# Altium footprint library IC.PcbLib: 162 footprints (part 9 of 11)
Each footprint in its own frame and in the unit in brackets; x right, y up, seen from the top. Pads: shape width x height; smd on the part's side, far side on the other; paste and mask are expansions set on the pad; w line width, h text height; cw(c..) or ccw(c..) is an arc to the next point about the centre after c.
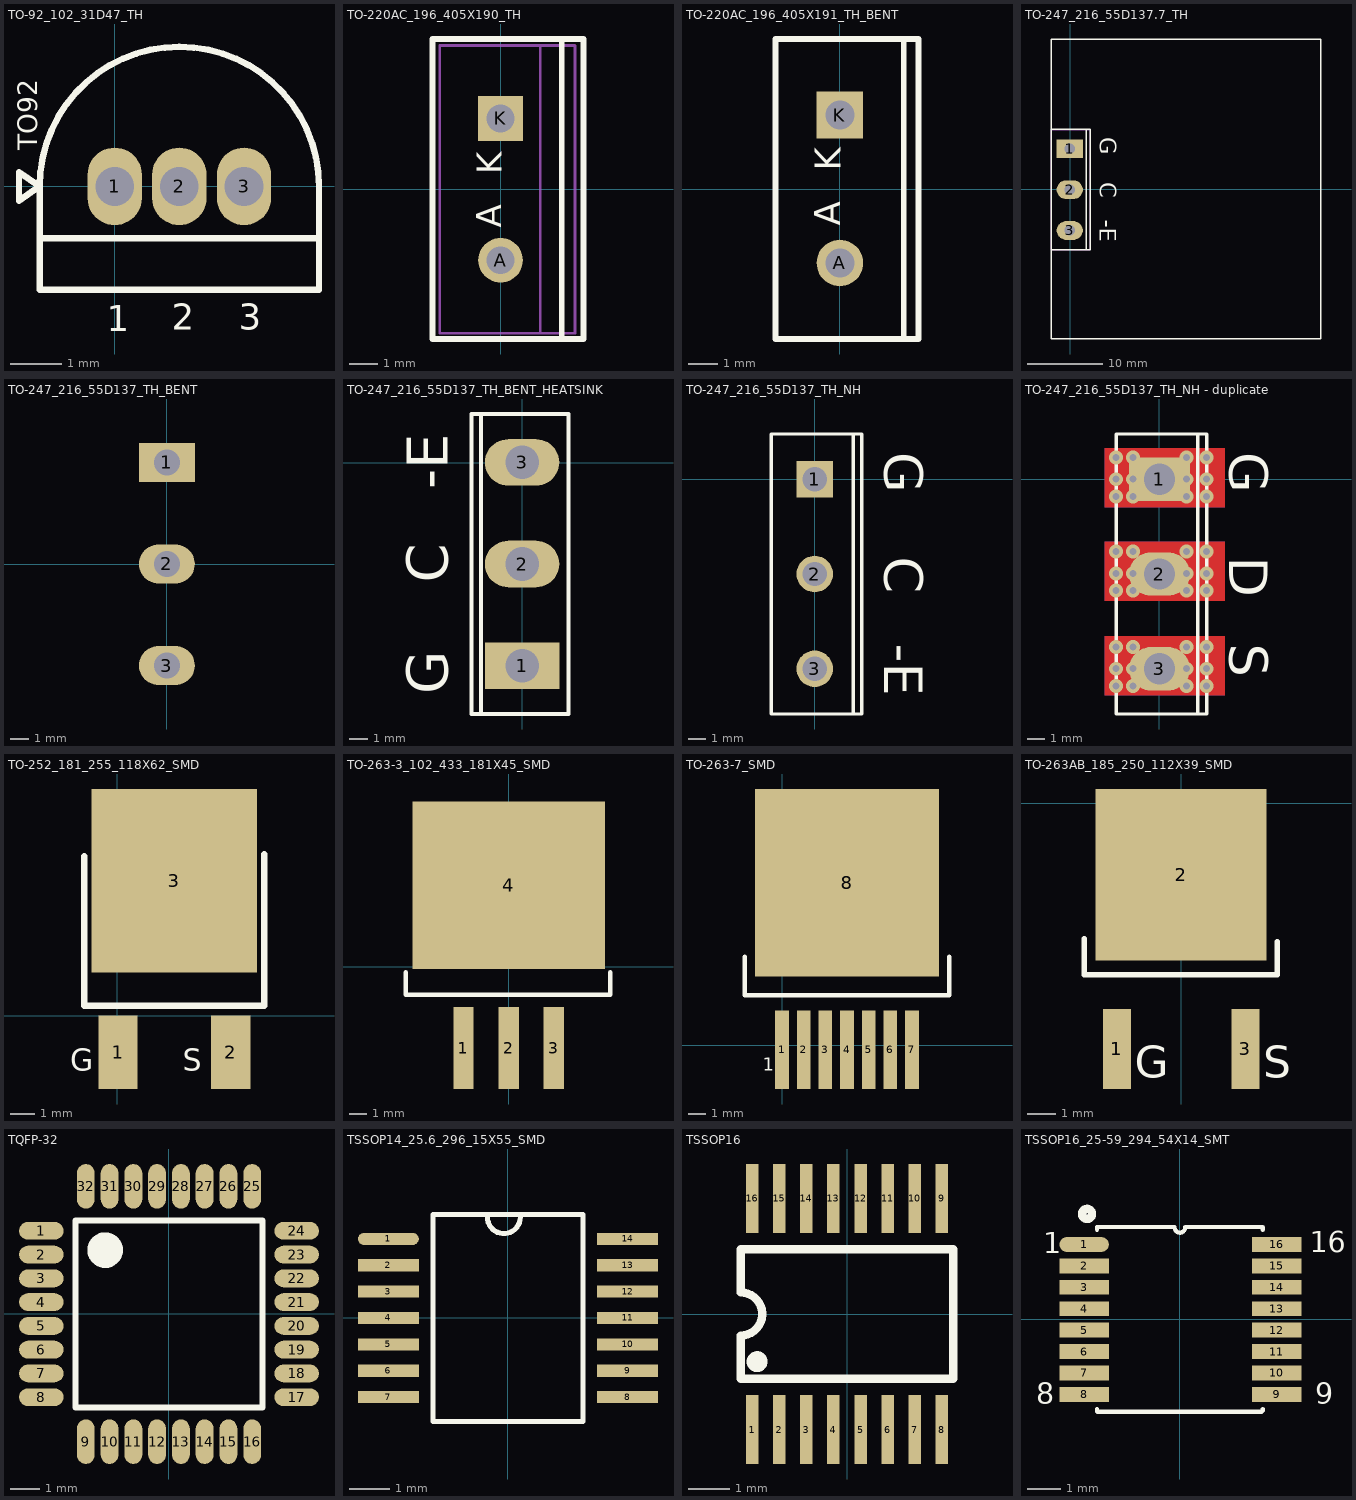
[diagram p8: the footprints below, top view; thin cyan lines are the x and y axes]

## TO-92_102_31D47_TH [mil] "CASE: TH"
height 342.52
pads (3):
  oval 42x60 hole 30 mask+3: 1(0,0) 2(50,0) 3(100,0)
Top Overlay:
  lines w5: -58,-40 158,-40 ; -58,0 cw(c50,0) 158,0 158,-80 -58,-80 -58,0 ; -58,0 -74,-11 -74,11 -58,0
  text "1" at -6,-112 h20
  text "2" at 44,-111 h20
  text "3" at 96,-111 h20
  text "TO92" at -60,28 h15
3D body "TO-92-2.STEP": height 418.5, standoff -140.55, extent -44.37,-63.73 144.39,93.75

## TO-220AC_196_405X190_TH [mm] "FM, 2-Leads, Body 10.3x4.85mm, Pitch 5.08mm"
height 19.05
pads (2):
  round 1.6 hole 1: A(0,-2.54)
  rect 1.6x1.6 hole 1: K(0,2.54)
Top Overlay:
  lines w0.2: 2.184,-5.258 2.195,5.334 ; -2.438,-5.359 2.972,-5.359 2.972,5.385 -2.438,5.385 -2.438,-5.359
  text "A" at 0.33,-1.372 h1.52
  text "K" at 0.356,0.533 h1.52
Mechanical 8:
  lines w0.1: 1.42,-5.15 1.42,5.15 ; -2.18,-5.15 2.67,-5.15 2.67,5.15 -2.18,5.15 -2.18,-5.15
3D body: height 14.33, standoff 12.8, extent 1.42,-4.975 2.67,4.975
3D body: height 19.05, standoff 18.18, extent 1.42,-4.975 2.67,4.975
3D body: height 14.37, standoff 14.33, extent 1.42,-4.975 2.67,-0.376
3D body: height 18.18, standoff 18.14, extent 1.42,-4.975 2.67,-0.376
3D body: height 14.48, standoff 14.36, extent 1.42,-4.975 2.67,-0.737
3D body: height 18.14, standoff 18.03, extent 1.42,-4.975 2.67,-0.737
3D body: height 2.79, standoff 0, extent -0.25,1.875 0.25,3.205
3D body: height 14.37, standoff 14.33, extent 1.42,0.376 2.67,4.975
3D body: height 18.18, standoff 18.14, extent 1.42,0.376 2.67,4.975
3D body: height 14.48, standoff 14.36, extent 1.42,0.737 2.67,4.975
3D body: height 18.14, standoff 18.03, extent 1.42,0.737 2.67,4.975
3D body: height 14.65, standoff 14.47, extent 1.42,1.069 2.67,4.975
3D body: height 18.03, standoff 17.85, extent 1.42,1.069 2.67,4.975
3D body: height 14.89, standoff 14.65, extent 1.42,1.361 2.67,4.975
3D body: height 17.86, standoff 17.61, extent 1.42,1.361 2.67,4.975
3D body: height 15.19, standoff 14.89, extent 1.42,1.601 2.67,4.975
3D body: height 17.62, standoff 17.32, extent 1.42,1.601 2.67,4.975
3D body: height 15.52, standoff 15.18, extent 1.42,1.778 2.67,4.975
3D body: height 17.32, standoff 16.99, extent 1.42,1.778 2.67,4.975
3D body: height 15.88, standoff 15.51, extent 1.42,1.888 2.67,4.975
3D body: height 16.99, standoff 16.63, extent 1.42,1.888 2.67,4.975
3D body: height 16.25, standoff 15.87, extent 1.42,1.925 2.67,4.975
3D body: height 16.63, standoff 16.25, extent 1.42,1.925 2.67,4.975
3D body: height 2.79, standoff 0, extent -0.25,-3.205 0.25,-1.875
3D body: height 14.65, standoff 14.47, extent 1.42,-4.975 2.67,-1.069
3D body: height 18.03, standoff 17.85, extent 1.42,-4.975 2.67,-1.069
3D body: height 14.89, standoff 14.65, extent 1.42,-4.975 2.67,-1.361
3D body: height 17.86, standoff 17.61, extent 1.42,-4.975 2.67,-1.361
3D body: height 15.19, standoff 14.89, extent 1.42,-4.975 2.67,-1.601
3D body: height 17.62, standoff 17.32, extent 1.42,-4.975 2.67,-1.601
3D body: height 15.52, standoff 15.18, extent 1.42,-4.975 2.67,-1.778
3D body: height 17.32, standoff 16.99, extent 1.42,-4.975 2.67,-1.778
3D body: height 15.88, standoff 15.51, extent 1.42,-4.975 2.67,-1.888
3D body: height 16.99, standoff 16.63, extent 1.42,-4.975 2.67,-1.888
3D body: height 16.25, standoff 15.87, extent 1.42,-4.975 2.67,-1.925
3D body: height 16.63, standoff 16.25, extent 1.42,-4.975 2.67,-1.925
3D body: height 0, standoff -1.6, extent -0.25,2.155 0.25,2.925
3D body: height 0, standoff -1.6, extent -0.25,-2.925 0.25,-2.155
3D body: height 12.8, standoff 2.79, extent -2.18,-5.15 2.67,5.15

## TO-220AC_196_405X191_TH_BENT [mm]
pads (2):
  round 1.6 hole 1: A(0,-2.54)
  rect 1.6x1.6 hole 1: K(0,2.54)
Top Overlay:
  lines w0.2: 2.195,-5.15 2.195,5.15 ; -2.205,-5.15 2.695,-5.15 2.695,5.15 -2.205,5.15 -2.205,-5.15
  text "K" at 0.33,0.635 h1.52
  text "A" at 0.305,-1.27 h1.52
3D body "User Library-TO220 L.step": height 7.2, standoff -0.3, extent -0.052,-4.9 19.652,5.1

## TO-247_216_55D137.7_TH [mm]
pads (3):
  rect 3.5x2.5 hole 1.4: 1(-0.076,5.425)
  oval 3.5x2.5 hole 1.4: 2(-0.076,-0.025) 3(-0.076,-5.475)
Top Overlay:
  lines w0.178: 2.134,-8.075 2.134,8.025 ; 33.426,20.091 -2.566,20.091 -2.566,8.025 ; 33.452,20.091 33.452,-19.964 -2.565,-19.964 -2.565,-8.076 -2.566,-8.075 ; -2.566,-8.075 -2.566,8.025 ; -2.566,-8.075 2.634,-8.075 2.634,8.025 -2.566,8.025
  text "G" at 3.924,6.975 h2.2
  text "C" at 3.924,0.975 h2.2
  text "-E" at 3.924,-4.025 h2.2
Mechanical 13:
  lines w0.1: 2.634,-8.05 2.634,8 ; 2.634,-8.05 -2.566,-8.05 -2.566,8 2.634,8 ; 2.634,-8.05 2.634,8
3D body "tony_assembly_14_asm.stp": height 52, standoff -2.2, extent -2.591,-19.949 33.57,20.051

## TO-247_216_55D137_TH_BENT [mm] "IGBT"
height 12
pads (3):
  rect 3x2.1 hole 1.4: 1(0,5.45)
  oval 3x2.1 hole 1.4: 2(0,0) 3(0,-5.45)
Bottom Overlay:
  lines w0.2: 2.21,-8.05 2.21,8.05 ; -2.49,-8.05 -2.49,8.05 2.71,8.05 2.71,-8.05 -2.49,-8.05
  text "E" at -5.5,-8 h2.2
  text "G" at -5.5,5 h2.2
  text "C" at -5.5,-0.5 h2.2
3D body "IGBT.STEP": height -5, standoff -9.9, extent 3.9,-7.75 23.9,7.75

## TO-247_216_55D137_TH_BENT_HEATSINK [mm] "CASE: TO-247"
height 30
pads (3):
  rect 4x2.5 hole 1.8: 1(0,-10.871)
  oval 4x2.5 hole 1.8: 2(0,-5.421) 3(0,0.029)
Top Overlay:
  lines w0.2: -2.21,-13.471 -2.21,2.629 ; -2.71,-13.471 -2.71,2.629 2.49,2.629 2.49,-13.471 -2.71,-13.471
  text "G" at -4,-12.421 h2.2
  text "C" at -4,-6.421 h2.2
  text "-E" at -4,-1.421 h2.2
3D body "IGBT and Heatsink.STEP": height 18.01, standoff -3.99, extent -7.173,-25.461 32.827,14.539

## TO-247_216_55D137_TH_NH [mm]
pads (3):
  rect 2.1x2.1 hole 1.4: 1(0,0)
  round 2.1 hole 1.4: 2(0,-5.45) 3(0,-10.9)
Top Overlay:
  lines w0.2: 2.21,-13.5 2.21,2.6 ; -2.49,-13.5 -2.49,2.6 2.71,2.6 2.71,-13.5 -2.49,-13.5
  text "G" at 4,1.55 h2.2
  text "C" at 4,-4.45 h2.2
  text "-E" at 4,-9.45 h2.2
3D body: height 25.57, standoff 4.17, extent -2.49,-13.475 2.71,2.575

## TO-247_216_55D137_TH_NH - duplicate [mm] "Power Mosfet"
height 24.78
pads (3):
  rect 3.5x2.5 hole 1.8: 1(0,0)
  oval 3.5x2.5 hole 1.8: 2(0,-5.45) 3(0,-10.9)
via -2.489,1.245 diameter 0.8 hole 0.4
via -2.49,-0.991 diameter 0.8 hole 0.4
via -2.489,0 diameter 0.8 hole 0.4
via -1.524,1.245 diameter 0.8 hole 0.4
via -1.524,-0.991 diameter 0.8 hole 0.4
via -1.524,-0.991 diameter 0.8 hole 0.4
via -1.524,0 diameter 0.8 hole 0.4
via 1.549,-0.991 diameter 0.8 hole 0.4
via 1.549,0 diameter 0.8 hole 0.4
via 1.549,1.245 diameter 0.8 hole 0.4
via 2.71,1.245 diameter 0.8 hole 0.4
via 2.71,0 diameter 0.8 hole 0.4
via 2.71,-0.991 diameter 0.8 hole 0.4
via 2.711,-6.401 diameter 0.8 hole 0.4
via 2.711,-5.41 diameter 0.8 hole 0.4
via 2.711,-4.166 diameter 0.8 hole 0.4
via 1.55,-4.166 diameter 0.8 hole 0.4
via 1.55,-5.41 diameter 0.8 hole 0.4
via 1.55,-6.401 diameter 0.8 hole 0.4
via -1.523,-5.41 diameter 0.8 hole 0.4
via -1.523,-6.401 diameter 0.8 hole 0.4
via -1.523,-4.166 diameter 0.8 hole 0.4
via -2.488,-5.41 diameter 0.8 hole 0.4
via -2.489,-6.401 diameter 0.8 hole 0.4
via -2.488,-4.166 diameter 0.8 hole 0.4
via 2.71,-11.887 diameter 0.8 hole 0.4
via 2.71,-10.897 diameter 0.8 hole 0.4
via 2.71,-9.652 diameter 0.8 hole 0.4
via 1.549,-9.652 diameter 0.8 hole 0.4
via 1.549,-10.897 diameter 0.8 hole 0.4
via 1.549,-11.887 diameter 0.8 hole 0.4
via -1.524,-10.897 diameter 0.8 hole 0.4
via -1.524,-11.887 diameter 0.8 hole 0.4
via -1.524,-9.652 diameter 0.8 hole 0.4
via -2.489,-10.897 diameter 0.8 hole 0.4
via -2.49,-11.887 diameter 0.8 hole 0.4
via -2.489,-9.652 diameter 0.8 hole 0.4
Top Layer:
  rectangle: -3.15,-1.626 3.759,1.803
  rectangle: -3.15,-7.01 3.759,-3.581
  rectangle: -3.15,-12.446 3.759,-9.017
Bottom Layer:
  region: 3.759,1.803 -3.15,1.803 -3.15,-1.626 3.759,-1.626
  region: 3.759,-3.581 -3.15,-3.581 -3.15,-7.01 3.759,-7.01
  region: 3.759,-9.017 -3.15,-9.017 -3.15,-12.446 3.759,-12.446
Top Overlay:
  lines w0.2: 2.21,-13.5 2.21,2.6 ; -2.49,-13.5 -2.49,2.6 2.71,2.6 2.71,-13.5 -2.49,-13.5
  text "G" at 4,1.55 h2.2
  text "D" at 4,-4.45 h2.2
  text "S" at 4,-9.45 h2.2
3D body "IGBT and Heatsink.STEP": height 18.01, standoff -3.99, extent -7.173,-25.49 32.827,14.51

## TO-252_181_255_118X62_SMD [mm] "CASE: TO-252"
height 2.4
pads (3):
  rect 1.6x3 smd: 1(0.037,-1.484) 2(4.637,-1.484)
  rect 6.75x7.5 smd: 3(2.337,5.512)
Top Overlay:
  lines w0.254: -1.346,6.516 -1.346,0.416 6,0.416 6,6.6
  text "S" at 2.667,-2.54 h1.52
  text "G" at -1.905,-2.54 h1.52
3D body "CircuitWorks-TO-252.step": height 2.31, standoff 0.01, extent -0.877,-1.282 5.703,8.418

## TO-263-3_102_433_181X45_SMD [mm] "CASE: TO-263"
height 4.57
pads (4):
  rect 1.15x4.6 smd: 1(-2.54,-4.575) 2(0,-4.575) 3(2.54,-4.575)
  rect 10.8x9.4 smd: 4(0,4.575)
Top Overlay:
  lines w0.254: -5.79,-0.325 -5.79,-1.575 5.71,-1.575 5.71,-0.325
3D body "69246.stp": height 4.51, standoff 0.01, extent -5.05,-6.469 5.05,8.921

## TO-263-7_SMD [mm] "CASE: TO-263"
height 4.7
pads (8):
  rect 0.8x4.6 smd: 1(0,-0.254) 2(1.27,-0.254) 3(2.54,-0.254) 4(3.81,-0.254) 5(5.08,-0.254) 6(6.35,-0.254) 7(7.62,-0.254)
  rect 10.8x11 smd: 8(3.81,9.531)
Top Overlay:
  lines w0.254: -2.19,5.2 -2.19,2.95 9.81,2.95 9.81,5.2
  text "1" at -1.143,-1.491 h0.76
3D body "User Library-TO263-7-1.STEP": height 4.81, standoff 0.01, extent -1.241,-1.781 8.759,13.889

## TO-263AB_185_250_112X39_SMD [mm] "CASE: TO-263"
height 4.6
pads (3):
  rect 1x2.85 smd: 1(-2.29,-8.75) 3(2.29,-8.75)
  rect 6.096x6.1 smd: 2(0,-2.54)
Top Overlay:
  lines w0.2: -3.454,-4.826 -3.454,-6.1 3.429,-6.1 3.429,-4.928
  text "G" at -1.651,-9.779 h1.14
  text "S" at 2.921,-9.779 h1.14
3D body "User Library-TO252AA.step": height 2.3, standoff -0.01, extent -3.302,-9.295 3.278,0.405

## TQFP-32 [mm] "TQFP, 32-Leads, Body 7.10x7.10mm, Pitch 0.80mm, IPC Medium Density"
height 1.2
pads (32):
  oval 1.5x0.6 smd mask+0.076: 1(-4.3,2.8) 2(-4.3,2) 3(-4.3,1.2) 4(-4.3,0.4) 5(-4.3,-0.4) 6(-4.3,-1.2) 7(-4.3,-2) 8(-4.3,-2.8) 17(4.3,-2.8) 18(4.3,-2) 19(4.3,-1.2) 20(4.3,-0.4) 21(4.3,0.4) 22(4.3,1.2) 23(4.3,2) 24(4.3,2.8)
  oval 0.6x1.5 smd mask+0.076: 9(-2.8,-4.3) 10(-2,-4.3) 11(-1.2,-4.3) 12(-0.4,-4.3) 13(0.4,-4.3) 14(1.2,-4.3) 15(2,-4.3) 16(2.8,-4.3) 25(2.8,4.3) 26(2,4.3) 27(1.2,4.3) 28(0.4,4.3) 29(-0.4,4.3) 30(-1.2,4.3) 31(-2,4.3) 32(-2.8,4.3)
Top Overlay:
  circle w0.6: c-2.15,2.15 r0.3
  lines w0.2: -3.15,-3.15 3.15,-3.15 3.15,3.15 -3.15,3.15 -3.15,-3.15
3D body "TQFP80P925X925X120-32N.step": height 1.2, standoff 0, extent -4.625,-4.625 4.625,4.625

## TSSOP14_25.6_296_15X55_SMD [mm] "CASE: TSSOP"
height 2
pads (14):
  oval 1.5x0.3 smd: 1(-2.95,1.95)
  rect 1.5x0.3 smd: 2(-2.95,1.3) 3(-2.95,0.65) 4(-2.95,0) 5(-2.95,-0.65) 6(-2.95,-1.3) 7(-2.95,-1.95) 8(2.95,-1.95) 9(2.95,-1.3) 10(2.95,-0.65) 11(2.95,0) 12(2.95,0.65) 13(2.95,1.3) 14(2.95,1.95)
Top Overlay:
  lines w0.127: -0.509,2.489 ccw(c-0.102,2.489) 0.306,2.489 ; -1.85,-2.55 -1.85,2.55 1.85,2.55 1.85,-2.55 -1.85,-2.55
3D body "TSSOP-14.STEP": height 1.2, standoff 0, extent -3.2,-2.5 3.2,2.5

## TSSOP16 [mm] "Shrink Small Outline; 16 Leads; Body Width 4.4 mm; Pitch 0.65 mm"
height 1.1
pads (16):
  rect 0.3x1.65 smd: 1(-2.275,-2.775) 2(-1.625,-2.775) 3(-0.975,-2.775) 4(-0.325,-2.775) 5(0.325,-2.775) 6(0.975,-2.775) 7(1.625,-2.775) 8(2.275,-2.775) 9(2.275,2.775) 10(1.625,2.775) 11(0.975,2.775) 12(0.325,2.775) 13(-0.325,2.775) 14(-0.975,2.775) 15(-1.625,2.775) 16(-2.275,2.775)
Top Overlay:
  circle w0.25: c-2.157,-1.143 r0.125
  lines w0.2: -2.55,-1.55 -2.55,-0.517 ccw(c-2.55,0) -2.55,0.517 -2.55,1.55 2.55,1.55 2.55,-1.55 -2.55,-1.55

## TSSOP16_25-59_294_54X14_SMT [mm] "TSOP, 16-Leads, Body 5.00x4.40mm, Pitch 0.65mm"
height 1.2
pads (16):
  oval 1.5x0.45 smd mask+0.076: 1(-2.908,2.273)
  rect 1.5x0.45 smd mask+0.076: 2(-2.908,1.623) 3(-2.908,0.973) 4(-2.908,0.323) 5(-2.908,-0.327) 6(-2.908,-0.977) 7(-2.908,-1.627) 8(-2.908,-2.277) 9(2.942,-2.277) 10(2.942,-1.627) 11(2.942,-0.977) 12(2.942,-0.327) 13(2.942,0.323) 14(2.942,0.973) 15(2.942,1.623) 16(2.942,2.273)
Top Overlay:
  circle w0.254: c-2.819,3.2 r0.152
  lines w0.127: -2.515,-2.718 -2.515,-2.794 -2.502,-2.807 2.477,-2.807 2.515,-2.769 2.515,-2.718 ; -2.515,2.718 -2.515,2.794 ; -2.515,2.807 -0.164,2.807 ; -0.162,2.796 ccw(c0,2.794) 0.163,2.794 ; 0.164,2.807 2.502,2.807 2.515,2.794 2.515,2.718
  text "1" at -4.152,2.011 h0.64
  text "16" at 3.937,2.032 h0.64
  text "9" at 4.103,-2.561 h0.64
  text "8" at -4.369,-2.565 h0.64
3D body "TSSOP-16 5_1x4_4.STEP": height 1.2, standoff 0.1, extent -3.2,-2.55 3.2,2.55